# Altium integrated library WCAP-ATG8_rev15a.intlib: 195 symbols (part 1 of 2)
Pins are listed as number, name and electrical type; pins without a type are passive.

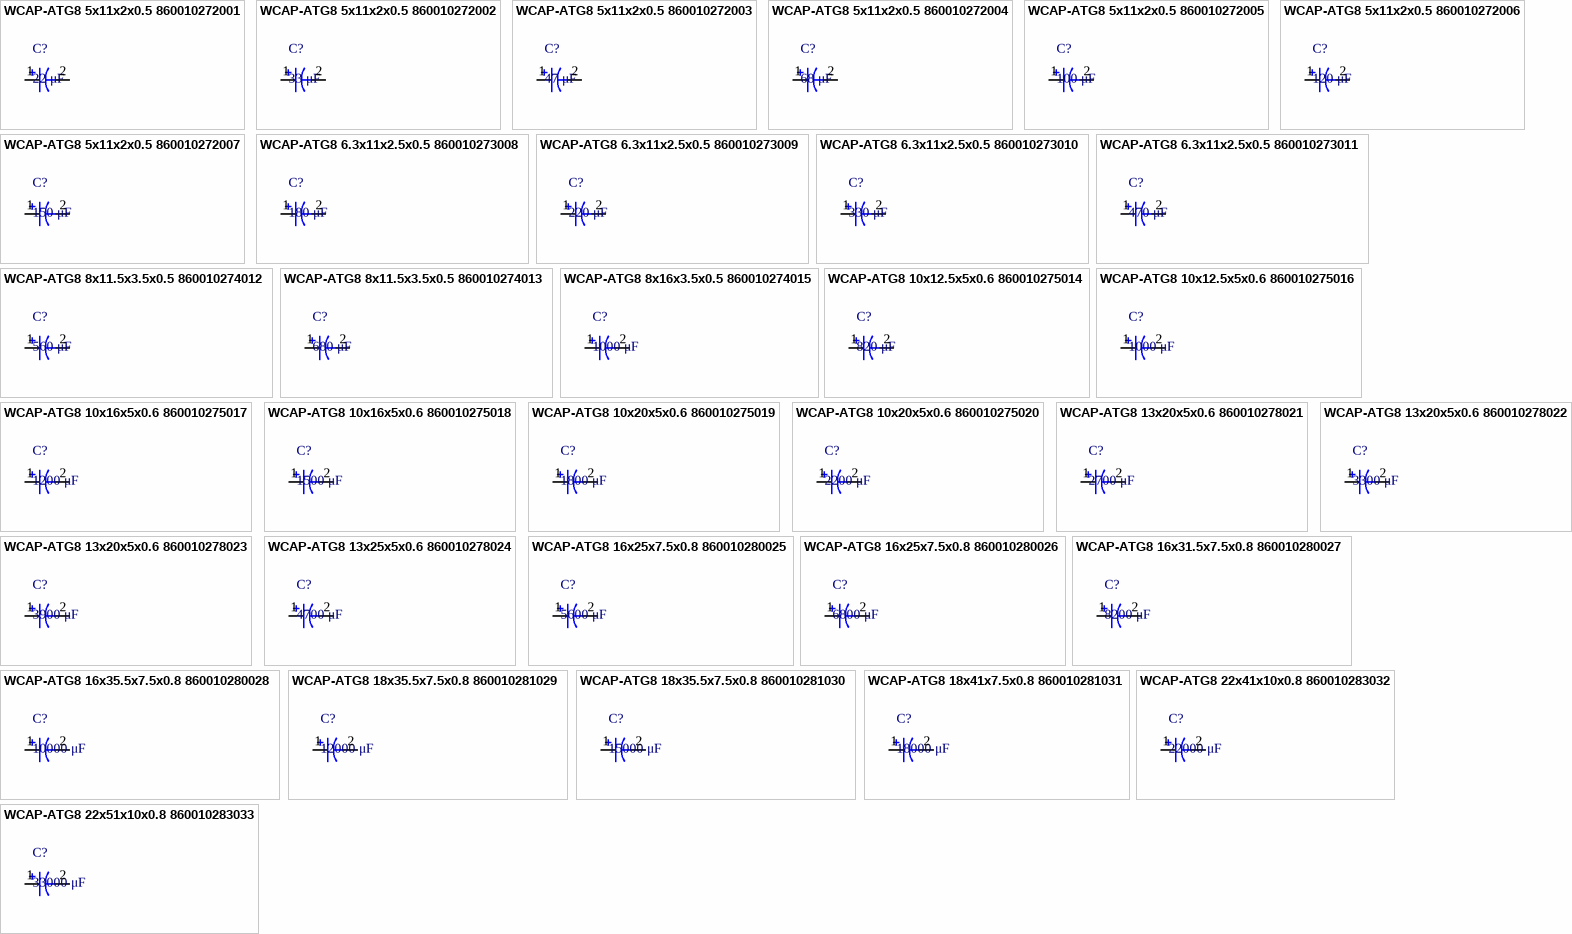
[diagram p0: symbols WCAP-ATG8 5x11x2x0.5 860010272001 to WCAP-ATG8 22x51x10x0.8 860010283033]

## WCAP-ATG8 5x11x2x0.5 860010272001
designator C?, comment 22 μF
WCAP-ATG8 Aluminum Electrolytic Capacitors , 22 μF; + / - 20%; 10 V , 5 x 11; Manufacturer: Wurth Elektronik; partNo: 860010272001; E-mail: libraries@we-online.com; Characteristics: Aluminum Electrolytic Capacitor; Recommended soldering: Wave; Operating temperature:–40 °C to +85 °C for UR < 400 V; 25 °C to +85 °C for UR ≥ 400 V; Wide capacitance value range; Load life: 2000 h @ +85 °C; ComponentLink1Description: Manufacturer; ComponentLink1URL: http://www.we-online.com; ComponentLink2Description: Datasheet; ComponentLink2URL: http://katalog.we-online.de/pbs/datasheet/860010272001.pdf; Created by: Karrer Zheng; Created Date: 6/8/2015; Capacitance: 22 μF; Application: Medium and high voltage type range from 160V-450V used as primary side input filter in power supply; Low voltage type used as energy storage or low frequency filtering in circuit, applied to general switching power supply, AC-DC converter, adapter, charger, TV, VCR, DC motor circuit filter, digital audio, digital cameras, digital video cameras, satellite receiver etc.
footprint WCAP-ATG8 5x11x2x0.5
pins: 1, 2

## WCAP-ATG8 5x11x2x0.5 860010272002
designator C?, comment 33 μF
WCAP-ATG8 Aluminum Electrolytic Capacitors , 33 μF; + / - 20%; 10 V , 5 x 11; Manufacturer: Wurth Elektronik; partNo: 860010272002; E-mail: libraries@we-online.com; Characteristics: Aluminum Electrolytic Capacitor; Recommended soldering: Wave; Operating temperature:–40 °C to +85 °C for UR < 400 V; 25 °C to +85 °C for UR ≥ 400 V; Wide capacitance value range; Load life: 2000 h @ +85 °C; ComponentLink1Description: Manufacturer; ComponentLink1URL: http://www.we-online.com; ComponentLink2Description: Datasheet; ComponentLink2URL: http://katalog.we-online.de/pbs/datasheet/860010272002.pdf; Created by: Karrer Zheng; Created Date: 6/8/2015; Capacitance: 33 μF; Application: Medium and high voltage type range from 160V-450V used as primary side input filter in power supply; Low voltage type used as energy storage or low frequency filtering in circuit, applied to general switching power supply, AC-DC converter, adapter, charger, TV, VCR, DC motor circuit filter, digital audio, digital cameras, digital video cameras, satellite receiver etc.
footprint WCAP-ATG8 5x11x2x0.5
pins: 1, 2

## WCAP-ATG8 5x11x2x0.5 860010272003
designator C?, comment 47 μF
WCAP-ATG8 Aluminum Electrolytic Capacitors , 47 μF; + / - 20%; 10 V , 5 x 11; Manufacturer: Wurth Elektronik; partNo: 860010272003; E-mail: libraries@we-online.com; Characteristics: Aluminum Electrolytic Capacitor; Recommended soldering: Wave; Operating temperature:–40 °C to +85 °C for UR < 400 V; 25 °C to +85 °C for UR ≥ 400 V; Wide capacitance value range; Load life: 2000 h @ +85 °C; ComponentLink1Description: Manufacturer; ComponentLink1URL: http://www.we-online.com; ComponentLink2Description: Datasheet; ComponentLink2URL: http://katalog.we-online.de/pbs/datasheet/860010272003.pdf; Created by: Karrer Zheng; Created Date: 6/8/2015; Capacitance: 47 μF; Application: Medium and high voltage type range from 160V-450V used as primary side input filter in power supply; Low voltage type used as energy storage or low frequency filtering in circuit, applied to general switching power supply, AC-DC converter, adapter, charger, TV, VCR, DC motor circuit filter, digital audio, digital cameras, digital video cameras, satellite receiver etc.
footprint WCAP-ATG8 5x11x2x0.5
pins: 1, 2

## WCAP-ATG8 5x11x2x0.5 860010272004
designator C?, comment 68 μF
WCAP-ATG8 Aluminum Electrolytic Capacitors , 68 μF; + / - 20%; 10 V , 5 x 11; Manufacturer: Wurth Elektronik; partNo: 860010272004; E-mail: libraries@we-online.com; Characteristics: Aluminum Electrolytic Capacitor; Recommended soldering: Wave; Operating temperature:–40 °C to +85 °C for UR < 400 V; 25 °C to +85 °C for UR ≥ 400 V; Wide capacitance value range; Load life: 2000 h @ +85 °C; ComponentLink1Description: Manufacturer; ComponentLink1URL: http://www.we-online.com; ComponentLink2Description: Datasheet; ComponentLink2URL: http://katalog.we-online.de/pbs/datasheet/860010272004.pdf; Created by: Karrer Zheng; Created Date: 6/8/2015; Capacitance: 68 μF; Application: Medium and high voltage type range from 160V-450V used as primary side input filter in power supply; Low voltage type used as energy storage or low frequency filtering in circuit, applied to general switching power supply, AC-DC converter, adapter, charger, TV, VCR, DC motor circuit filter, digital audio, digital cameras, digital video cameras, satellite receiver etc.
footprint WCAP-ATG8 5x11x2x0.5
pins: 1, 2

## WCAP-ATG8 5x11x2x0.5 860010272005
designator C?, comment 100 μF
WCAP-ATG8 Aluminum Electrolytic Capacitors , 100 μF; + / - 20%; 10 V , 5 x 11; Manufacturer: Wurth Elektronik; partNo: 860010272005; E-mail: libraries@we-online.com; Characteristics: Aluminum Electrolytic Capacitor; Recommended soldering: Wave; Operating temperature:–40 °C to +85 °C for UR < 400 V; 25 °C to +85 °C for UR ≥ 400 V; Wide capacitance value range; Load life: 2000 h @ +85 °C; ComponentLink1Description: Manufacturer; ComponentLink1URL: http://www.we-online.com; ComponentLink2Description: Datasheet; ComponentLink2URL: http://katalog.we-online.de/pbs/datasheet/860010272005.pdf; Created by: Karrer Zheng; Created Date: 6/8/2015; Capacitance: 100 μF; Application: Medium and high voltage type range from 160V-450V used as primary side input filter in power supply; Low voltage type used as energy storage or low frequency filtering in circuit, applied to general switching power supply, AC-DC converter, adapter, charger, TV, VCR, DC motor circuit filter, digital audio, digital cameras, digital video cameras, satellite receiver etc.
footprint WCAP-ATG8 5x11x2x0.5
pins: 1, 2

## WCAP-ATG8 5x11x2x0.5 860010272006
designator C?, comment 120 μF
WCAP-ATG8 Aluminum Electrolytic Capacitors , 120 μF; + / - 20%; 10 V , 5 x 11; Manufacturer: Wurth Elektronik; partNo: 860010272006; E-mail: libraries@we-online.com; Characteristics: Aluminum Electrolytic Capacitor; Recommended soldering: Wave; Operating temperature:–40 °C to +85 °C for UR < 400 V; 25 °C to +85 °C for UR ≥ 400 V; Wide capacitance value range; Load life: 2000 h @ +85 °C; ComponentLink1Description: Manufacturer; ComponentLink1URL: http://www.we-online.com; ComponentLink2Description: Datasheet; ComponentLink2URL: http://katalog.we-online.de/pbs/datasheet/860010272006.pdf; Created by: Karrer Zheng; Created Date: 6/8/2015; Capacitance: 120 μF; Application: Medium and high voltage type range from 160V-450V used as primary side input filter in power supply; Low voltage type used as energy storage or low frequency filtering in circuit, applied to general switching power supply, AC-DC converter, adapter, charger, TV, VCR, DC motor circuit filter, digital audio, digital cameras, digital video cameras, satellite receiver etc.
footprint WCAP-ATG8 5x11x2x0.5
pins: 1, 2

## WCAP-ATG8 5x11x2x0.5 860010272007
designator C?, comment 150 μF
WCAP-ATG8 Aluminum Electrolytic Capacitors , 150 μF; + / - 20%; 10 V , 5 x 11; Manufacturer: Wurth Elektronik; partNo: 860010272007; E-mail: libraries@we-online.com; Characteristics: Aluminum Electrolytic Capacitor; Recommended soldering: Wave; Operating temperature:–40 °C to +85 °C for UR < 400 V; 25 °C to +85 °C for UR ≥ 400 V; Wide capacitance value range; Load life: 2000 h @ +85 °C; ComponentLink1Description: Manufacturer; ComponentLink1URL: http://www.we-online.com; ComponentLink2Description: Datasheet; ComponentLink2URL: http://katalog.we-online.de/pbs/datasheet/860010272007.pdf; Created by: Karrer Zheng; Created Date: 6/8/2015; Capacitance: 150 μF; Application: Medium and high voltage type range from 160V-450V used as primary side input filter in power supply; Low voltage type used as energy storage or low frequency filtering in circuit, applied to general switching power supply, AC-DC converter, adapter, charger, TV, VCR, DC motor circuit filter, digital audio, digital cameras, digital video cameras, satellite receiver etc.
footprint WCAP-ATG8 5x11x2x0.5
pins: 1, 2

## WCAP-ATG8 6.3x11x2.5x0.5 860010273008
designator C?, comment 180 μF
WCAP-ATG8 Aluminum Electrolytic Capacitors , 180 μF; + / - 20%; 10 V , 6,3 x 11; Manufacturer: Wurth Elektronik; partNo: 860010273008; E-mail: libraries@we-online.com; Characteristics: Aluminum Electrolytic Capacitor; Recommended soldering: Wave; Operating temperature:–40 °C to +85 °C for UR < 400 V; 25 °C to +85 °C for UR ≥ 400 V; Wide capacitance value range; Load life: 2000 h @ +85 °C; ComponentLink1Description: Manufacturer; ComponentLink1URL: http://www.we-online.com; ComponentLink2Description: Datasheet; ComponentLink2URL: http://katalog.we-online.de/pbs/datasheet/860010273008.pdf; Created by: Karrer Zheng; Created Date: 6/8/2015; Capacitance: 180 μF; Application: Medium and high voltage type range from 160V-450V used as primary side input filter in power supply; Low voltage type used as energy storage or low frequency filtering in circuit, applied to general switching power supply, AC-DC converter, adapter, charger, TV, VCR, DC motor circuit filter, digital audio, digital cameras, digital video cameras, satellite receiver etc.
footprint WCAP-ATG8 6.3x11x2.5x0.5
pins: 1, 2

## WCAP-ATG8 6.3x11x2.5x0.5 860010273009
designator C?, comment 220 μF
WCAP-ATG8 Aluminum Electrolytic Capacitors , 220 μF; + / - 20%; 10 V , 6,3 x 11; Manufacturer: Wurth Elektronik; partNo: 860010273009; E-mail: libraries@we-online.com; Characteristics: Aluminum Electrolytic Capacitor; Recommended soldering: Wave; Operating temperature:–40 °C to +85 °C for UR < 400 V; 25 °C to +85 °C for UR ≥ 400 V; Wide capacitance value range; Load life: 2000 h @ +85 °C; ComponentLink1Description: Manufacturer; ComponentLink1URL: http://www.we-online.com; ComponentLink2Description: Datasheet; ComponentLink2URL: http://katalog.we-online.de/pbs/datasheet/860010273009.pdf; Created by: Karrer Zheng; Created Date: 6/8/2015; Capacitance: 220 μF; Application: Medium and high voltage type range from 160V-450V used as primary side input filter in power supply; Low voltage type used as energy storage or low frequency filtering in circuit, applied to general switching power supply, AC-DC converter, adapter, charger, TV, VCR, DC motor circuit filter, digital audio, digital cameras, digital video cameras, satellite receiver etc.
footprint WCAP-ATG8 6.3x11x2.5x0.5
pins: 1, 2

## WCAP-ATG8 6.3x11x2.5x0.5 860010273010
designator C?, comment 330 μF
WCAP-ATG8 Aluminum Electrolytic Capacitors , 330 μF; + / - 20%; 10 V , 6,3 x 11; Manufacturer: Wurth Elektronik; partNo: 860010273010; E-mail: libraries@we-online.com; Characteristics: Aluminum Electrolytic Capacitor; Recommended soldering: Wave; Operating temperature:–40 °C to +85 °C for UR < 400 V; 25 °C to +85 °C for UR ≥ 400 V; Wide capacitance value range; Load life: 2000 h @ +85 °C; ComponentLink1Description: Manufacturer; ComponentLink1URL: http://www.we-online.com; ComponentLink2Description: Datasheet; ComponentLink2URL: http://katalog.we-online.de/pbs/datasheet/860010273010.pdf; Created by: Karrer Zheng; Created Date: 6/8/2015; Capacitance: 330 μF; Application: Medium and high voltage type range from 160V-450V used as primary side input filter in power supply; Low voltage type used as energy storage or low frequency filtering in circuit, applied to general switching power supply, AC-DC converter, adapter, charger, TV, VCR, DC motor circuit filter, digital audio, digital cameras, digital video cameras, satellite receiver etc.
footprint WCAP-ATG8 6.3x11x2.5x0.5
pins: 1, 2

## WCAP-ATG8 6.3x11x2.5x0.5 860010273011
designator C?, comment 470 μF
WCAP-ATG8 Aluminum Electrolytic Capacitors , 470 μF; + / - 20%; 10 V , 6,3 x 11; Manufacturer: Wurth Elektronik; partNo: 860010273011; E-mail: libraries@we-online.com; Characteristics: Aluminum Electrolytic Capacitor; Recommended soldering: Wave; Operating temperature:–40 °C to +85 °C for UR < 400 V; 25 °C to +85 °C for UR ≥ 400 V; Wide capacitance value range; Load life: 2000 h @ +85 °C; ComponentLink1Description: Manufacturer; ComponentLink1URL: http://www.we-online.com; ComponentLink2Description: Datasheet; ComponentLink2URL: http://katalog.we-online.de/pbs/datasheet/860010273011.pdf; Created by: Karrer Zheng; Created Date: 6/8/2015; Capacitance: 470 μF; Application: Medium and high voltage type range from 160V-450V used as primary side input filter in power supply; Low voltage type used as energy storage or low frequency filtering in circuit, applied to general switching power supply, AC-DC converter, adapter, charger, TV, VCR, DC motor circuit filter, digital audio, digital cameras, digital video cameras, satellite receiver etc.
footprint WCAP-ATG8 6.3x11x2.5x0.5
pins: 1, 2

## WCAP-ATG8 8x11.5x3.5x0.5 860010274012
designator C?, comment 560 μF
WCAP-ATG8 Aluminum Electrolytic Capacitors , 560 μF; + / - 20%; 10 V , 8 x 11,5; Manufacturer: Wurth Elektronik; partNo: 860010274012; E-mail: libraries@we-online.com; Characteristics: Aluminum Electrolytic Capacitor; Recommended soldering: Wave; Operating temperature:–40 °C to +85 °C for UR < 400 V; 25 °C to +85 °C for UR ≥ 400 V; Wide capacitance value range; Load life: 2000 h @ +85 °C; ComponentLink1Description: Manufacturer; ComponentLink1URL: http://www.we-online.com; ComponentLink2Description: Datasheet; ComponentLink2URL: http://katalog.we-online.de/pbs/datasheet/860010274012.pdf; Created by: Karrer Zheng; Created Date: 6/8/2015; Capacitance: 560 μF; Application: Medium and high voltage type range from 160V-450V used as primary side input filter in power supply; Low voltage type used as energy storage or low frequency filtering in circuit, applied to general switching power supply, AC-DC converter, adapter, charger, TV, VCR, DC motor circuit filter, digital audio, digital cameras, digital video cameras, satellite receiver etc.
footprint WCAP-ATG8 8x11.5x3.5x0.5
pins: 1, 2

## WCAP-ATG8 8x11.5x3.5x0.5 860010274013
designator C?, comment 680 μF
WCAP-ATG8 Aluminum Electrolytic Capacitors , 680 μF; + / - 20%; 10 V , 8 x 11,5; Manufacturer: Wurth Elektronik; partNo: 860010274013; E-mail: libraries@we-online.com; Characteristics: Aluminum Electrolytic Capacitor; Recommended soldering: Wave; Operating temperature:–40 °C to +85 °C for UR < 400 V; 25 °C to +85 °C for UR ≥ 400 V; Wide capacitance value range; Load life: 2000 h @ +85 °C; ComponentLink1Description: Manufacturer; ComponentLink1URL: http://www.we-online.com; ComponentLink2Description: Datasheet; ComponentLink2URL: http://katalog.we-online.de/pbs/datasheet/860010274013.pdf; Created by: Karrer Zheng; Created Date: 6/8/2015; Capacitance: 680 μF; Application: Medium and high voltage type range from 160V-450V used as primary side input filter in power supply; Low voltage type used as energy storage or low frequency filtering in circuit, applied to general switching power supply, AC-DC converter, adapter, charger, TV, VCR, DC motor circuit filter, digital audio, digital cameras, digital video cameras, satellite receiver etc.
footprint WCAP-ATG8 8x11.5x3.5x0.5
pins: 1, 2

## WCAP-ATG8 8x16x3.5x0.5 860010274015
designator C?, comment 1000 μF
WCAP-ATG8 Aluminum Electrolytic Capacitors , 1000 μF; + / - 20%; 10 V , 8 x 16; Manufacturer: Wurth Elektronik; partNo: 860010274015; E-mail: libraries@we-online.com; Characteristics: Aluminum Electrolytic Capacitor; Recommended soldering: Wave; Operating temperature:–40 °C to +85 °C for UR < 400 V; 25 °C to +85 °C for UR ≥ 400 V; Wide capacitance value range; Load life: 2000 h @ +85 °C; ComponentLink1Description: Manufacturer; ComponentLink1URL: http://www.we-online.com; ComponentLink2Description: Datasheet; ComponentLink2URL: http://katalog.we-online.de/pbs/datasheet/860010274015.pdf; Created by: Karrer Zheng; Created Date: 6/8/2015; Capacitance: 1000 μF; Application: Medium and high voltage type range from 160V-450V used as primary side input filter in power supply; Low voltage type used as energy storage or low frequency filtering in circuit, applied to general switching power supply, AC-DC converter, adapter, charger, TV, VCR, DC motor circuit filter, digital audio, digital cameras, digital video cameras, satellite receiver etc.
footprint WCAP-ATG8 8x16x3.5x0.5
pins: 1, 2

## WCAP-ATG8 10x12.5x5x0.6 860010275014
designator C?, comment 820 μF
WCAP-ATG8 Aluminum Electrolytic Capacitors , 820 μF; + / - 20%; 10 V , 10 x 12,5; Manufacturer: Wurth Elektronik; partNo: 860010275014; E-mail: libraries@we-online.com; Characteristics: Aluminum Electrolytic Capacitor; Recommended soldering: Wave; Operating temperature:–40 °C to +85 °C for UR < 400 V; 25 °C to +85 °C for UR ≥ 400 V; Wide capacitance value range; Load life: 2000 h @ +85 °C; ComponentLink1Description: Manufacturer; ComponentLink1URL: http://www.we-online.com; ComponentLink2Description: Datasheet; ComponentLink2URL: http://katalog.we-online.de/pbs/datasheet/860010275014.pdf; Created by: Karrer Zheng; Created Date: 6/8/2015; Capacitance: 820 μF; Application: Medium and high voltage type range from 160V-450V used as primary side input filter in power supply; Low voltage type used as energy storage or low frequency filtering in circuit, applied to general switching power supply, AC-DC converter, adapter, charger, TV, VCR, DC motor circuit filter, digital audio, digital cameras, digital video cameras, satellite receiver etc.
footprint WCAP-ATG8 10x12.5x5x0.6
pins: 1, 2

## WCAP-ATG8 10x12.5x5x0.6 860010275016
designator C?, comment 1000 μF
WCAP-ATG8 Aluminum Electrolytic Capacitors , 1000 μF; + / - 20%; 10 V , 10 x 12,5; Manufacturer: Wurth Elektronik; partNo: 860010275016; E-mail: libraries@we-online.com; Characteristics: Aluminum Electrolytic Capacitor; Recommended soldering: Wave; Operating temperature:–40 °C to +85 °C for UR < 400 V; 25 °C to +85 °C for UR ≥ 400 V; Wide capacitance value range; Load life: 2000 h @ +85 °C; ComponentLink1Description: Manufacturer; ComponentLink1URL: http://www.we-online.com; ComponentLink2Description: Datasheet; ComponentLink2URL: http://katalog.we-online.de/pbs/datasheet/860010275016.pdf; Created by: Karrer Zheng; Created Date: 6/8/2015; Capacitance: 1000 μF; Application: Medium and high voltage type range from 160V-450V used as primary side input filter in power supply; Low voltage type used as energy storage or low frequency filtering in circuit, applied to general switching power supply, AC-DC converter, adapter, charger, TV, VCR, DC motor circuit filter, digital audio, digital cameras, digital video cameras, satellite receiver etc.
footprint WCAP-ATG8 10x12.5x5x0.6
pins: 1, 2

## WCAP-ATG8 10x16x5x0.6 860010275017
designator C?, comment 1200 μF
WCAP-ATG8 Aluminum Electrolytic Capacitors , 1200 μF; + / - 20%; 10 V , 10 x 16; Manufacturer: Wurth Elektronik; partNo: 860010275017; E-mail: libraries@we-online.com; Characteristics: Aluminum Electrolytic Capacitor; Recommended soldering: Wave; Operating temperature:–40 °C to +85 °C for UR < 400 V; 25 °C to +85 °C for UR ≥ 400 V; Wide capacitance value range; Load life: 2000 h @ +85 °C; ComponentLink1Description: Manufacturer; ComponentLink1URL: http://www.we-online.com; ComponentLink2Description: Datasheet; ComponentLink2URL: http://katalog.we-online.de/pbs/datasheet/860010275017.pdf; Created by: Karrer Zheng; Created Date: 6/8/2015; Capacitance: 1200 μF; Application: Medium and high voltage type range from 160V-450V used as primary side input filter in power supply; Low voltage type used as energy storage or low frequency filtering in circuit, applied to general switching power supply, AC-DC converter, adapter, charger, TV, VCR, DC motor circuit filter, digital audio, digital cameras, digital video cameras, satellite receiver etc.
footprint WCAP-ATG8 10x16x5x0.6
pins: 1, 2

## WCAP-ATG8 10x16x5x0.6 860010275018
designator C?, comment 1500 μF
WCAP-ATG8 Aluminum Electrolytic Capacitors , 1500 μF; + / - 20%; 10 V , 10 x 16; Manufacturer: Wurth Elektronik; partNo: 860010275018; E-mail: libraries@we-online.com; Characteristics: Aluminum Electrolytic Capacitor; Recommended soldering: Wave; Operating temperature:–40 °C to +85 °C for UR < 400 V; 25 °C to +85 °C for UR ≥ 400 V; Wide capacitance value range; Load life: 2000 h @ +85 °C; ComponentLink1Description: Manufacturer; ComponentLink1URL: http://www.we-online.com; ComponentLink2Description: Datasheet; ComponentLink2URL: http://katalog.we-online.de/pbs/datasheet/860010275018.pdf; Created by: Karrer Zheng; Created Date: 6/8/2015; Capacitance: 1500 μF; Application: Medium and high voltage type range from 160V-450V used as primary side input filter in power supply; Low voltage type used as energy storage or low frequency filtering in circuit, applied to general switching power supply, AC-DC converter, adapter, charger, TV, VCR, DC motor circuit filter, digital audio, digital cameras, digital video cameras, satellite receiver etc.
footprint WCAP-ATG8 10x16x5x0.6
pins: 1, 2

## WCAP-ATG8 10x20x5x0.6 860010275019
designator C?, comment 1800 μF
WCAP-ATG8 Aluminum Electrolytic Capacitors , 1800 μF; + / - 20%; 10 V , 10 x 20; Manufacturer: Wurth Elektronik; partNo: 860010275019; E-mail: libraries@we-online.com; Characteristics: Aluminum Electrolytic Capacitor; Recommended soldering: Wave; Operating temperature:–40 °C to +85 °C for UR < 400 V; 25 °C to +85 °C for UR ≥ 400 V; Wide capacitance value range; Load life: 2000 h @ +85 °C; ComponentLink1Description: Manufacturer; ComponentLink1URL: http://www.we-online.com; ComponentLink2Description: Datasheet; ComponentLink2URL: http://katalog.we-online.de/pbs/datasheet/860010275019.pdf; Created by: Karrer Zheng; Created Date: 6/8/2015; Capacitance: 1800 μF; Application: Medium and high voltage type range from 160V-450V used as primary side input filter in power supply; Low voltage type used as energy storage or low frequency filtering in circuit, applied to general switching power supply, AC-DC converter, adapter, charger, TV, VCR, DC motor circuit filter, digital audio, digital cameras, digital video cameras, satellite receiver etc.
footprint WCAP-ATG8 10x20x5x0.6
pins: 1, 2

## WCAP-ATG8 10x20x5x0.6 860010275020
designator C?, comment 2200 μF
WCAP-ATG8 Aluminum Electrolytic Capacitors , 2200 μF; + / - 20%; 10 V , 10 x 20; Manufacturer: Wurth Elektronik; partNo: 860010275020; E-mail: libraries@we-online.com; Characteristics: Aluminum Electrolytic Capacitor; Recommended soldering: Wave; Operating temperature:–40 °C to +85 °C for UR < 400 V; 25 °C to +85 °C for UR ≥ 400 V; Wide capacitance value range; Load life: 2000 h @ +85 °C; ComponentLink1Description: Manufacturer; ComponentLink1URL: http://www.we-online.com; ComponentLink2Description: Datasheet; ComponentLink2URL: http://katalog.we-online.de/pbs/datasheet/860010275020.pdf; Created by: Karrer Zheng; Created Date: 6/8/2015; Capacitance: 2200 μF; Application: Medium and high voltage type range from 160V-450V used as primary side input filter in power supply; Low voltage type used as energy storage or low frequency filtering in circuit, applied to general switching power supply, AC-DC converter, adapter, charger, TV, VCR, DC motor circuit filter, digital audio, digital cameras, digital video cameras, satellite receiver etc.
footprint WCAP-ATG8 10x20x5x0.6
pins: 1, 2

## WCAP-ATG8 13x20x5x0.6 860010278021
designator C?, comment 2700 μF
WCAP-ATG8 Aluminum Electrolytic Capacitors , 2700 μF; + / - 20%; 10 V , 13 x 20; Manufacturer: Wurth Elektronik; partNo: 860010278021; E-mail: libraries@we-online.com; Characteristics: Aluminum Electrolytic Capacitor; Recommended soldering: Wave; Operating temperature:–40 °C to +85 °C for UR < 400 V; 25 °C to +85 °C for UR ≥ 400 V; Wide capacitance value range; Load life: 2000 h @ +85 °C; ComponentLink1Description: Manufacturer; ComponentLink1URL: http://www.we-online.com; ComponentLink2Description: Datasheet; ComponentLink2URL: http://katalog.we-online.de/pbs/datasheet/860010278021.pdf; Created by: Karrer Zheng; Created Date: 6/8/2015; Capacitance: 2700 μF; Application: Medium and high voltage type range from 160V-450V used as primary side input filter in power supply; Low voltage type used as energy storage or low frequency filtering in circuit, applied to general switching power supply, AC-DC converter, adapter, charger, TV, VCR, DC motor circuit filter, digital audio, digital cameras, digital video cameras, satellite receiver etc.
footprint WCAP-ATG8 13x20x5x0.6
pins: 1, 2

## WCAP-ATG8 13x20x5x0.6 860010278022
designator C?, comment 3300 μF
WCAP-ATG8 Aluminum Electrolytic Capacitors , 3300 μF; + / - 20%; 10 V , 13 x 20; Manufacturer: Wurth Elektronik; partNo: 860010278022; E-mail: libraries@we-online.com; Characteristics: Aluminum Electrolytic Capacitor; Recommended soldering: Wave; Operating temperature:–40 °C to +85 °C for UR < 400 V; 25 °C to +85 °C for UR ≥ 400 V; Wide capacitance value range; Load life: 2000 h @ +85 °C; ComponentLink1Description: Manufacturer; ComponentLink1URL: http://www.we-online.com; ComponentLink2Description: Datasheet; ComponentLink2URL: http://katalog.we-online.de/pbs/datasheet/860010278022.pdf; Created by: Karrer Zheng; Created Date: 6/8/2015; Capacitance: 3300 μF; Application: Medium and high voltage type range from 160V-450V used as primary side input filter in power supply; Low voltage type used as energy storage or low frequency filtering in circuit, applied to general switching power supply, AC-DC converter, adapter, charger, TV, VCR, DC motor circuit filter, digital audio, digital cameras, digital video cameras, satellite receiver etc.
footprint WCAP-ATG8 13x20x5x0.6
pins: 1, 2

## WCAP-ATG8 13x20x5x0.6 860010278023
designator C?, comment 3900 μF
WCAP-ATG8 Aluminum Electrolytic Capacitors , 3900 μF; + / - 20%; 10 V , 13 x 20; Manufacturer: Wurth Elektronik; partNo: 860010278023; E-mail: libraries@we-online.com; Characteristics: Aluminum Electrolytic Capacitor; Recommended soldering: Wave; Operating temperature:–40 °C to +85 °C for UR < 400 V; 25 °C to +85 °C for UR ≥ 400 V; Wide capacitance value range; Load life: 2000 h @ +85 °C; ComponentLink1Description: Manufacturer; ComponentLink1URL: http://www.we-online.com; ComponentLink2Description: Datasheet; ComponentLink2URL: http://katalog.we-online.de/pbs/datasheet/860010278023.pdf; Created by: Karrer Zheng; Created Date: 6/8/2015; Capacitance: 3900 μF; Application: Medium and high voltage type range from 160V-450V used as primary side input filter in power supply; Low voltage type used as energy storage or low frequency filtering in circuit, applied to general switching power supply, AC-DC converter, adapter, charger, TV, VCR, DC motor circuit filter, digital audio, digital cameras, digital video cameras, satellite receiver etc.
footprint WCAP-ATG8 13x20x5x0.6
pins: 1, 2

## WCAP-ATG8 13x25x5x0.6 860010278024
designator C?, comment 4700 μF
WCAP-ATG8 Aluminum Electrolytic Capacitors , 4700 μF; + / - 20%; 10 V , 13 x 25; Manufacturer: Wurth Elektronik; partNo: 860010278024; E-mail: libraries@we-online.com; Characteristics: Aluminum Electrolytic Capacitor; Recommended soldering: Wave; Operating temperature:–40 °C to +85 °C for UR < 400 V; 25 °C to +85 °C for UR ≥ 400 V; Wide capacitance value range; Load life: 2000 h @ +85 °C; ComponentLink1Description: Manufacturer; ComponentLink1URL: http://www.we-online.com; ComponentLink2Description: Datasheet; ComponentLink2URL: http://katalog.we-online.de/pbs/datasheet/860010278024.pdf; Created by: Karrer Zheng; Created Date: 6/8/2015; Capacitance: 4700 μF; Application: Medium and high voltage type range from 160V-450V used as primary side input filter in power supply; Low voltage type used as energy storage or low frequency filtering in circuit, applied to general switching power supply, AC-DC converter, adapter, charger, TV, VCR, DC motor circuit filter, digital audio, digital cameras, digital video cameras, satellite receiver etc.
footprint WCAP-ATG8 13x25x5x0.6
pins: 1, 2

## WCAP-ATG8 16x25x7.5x0.8 860010280025
designator C?, comment 5600 μF
WCAP-ATG8 Aluminum Electrolytic Capacitors , 5600 μF; + / - 20%; 10 V , 16 x 25; Manufacturer: Wurth Elektronik; partNo: 860010280025; E-mail: libraries@we-online.com; Characteristics: Aluminum Electrolytic Capacitor; Recommended soldering: Wave; Operating temperature:–40 °C to +85 °C for UR < 400 V; 25 °C to +85 °C for UR ≥ 400 V; Wide capacitance value range; Load life: 2000 h @ +85 °C; ComponentLink1Description: Manufacturer; ComponentLink1URL: http://www.we-online.com; ComponentLink2Description: Datasheet; ComponentLink2URL: http://katalog.we-online.de/pbs/datasheet/860010280025.pdf; Created by: Karrer Zheng; Created Date: 6/8/2015; Capacitance: 5600 μF; Application: Medium and high voltage type range from 160V-450V used as primary side input filter in power supply; Low voltage type used as energy storage or low frequency filtering in circuit, applied to general switching power supply, AC-DC converter, adapter, charger, TV, VCR, DC motor circuit filter, digital audio, digital cameras, digital video cameras, satellite receiver etc.
footprint WCAP-ATG8 16x25x7.5x0.8
pins: 1, 2

## WCAP-ATG8 16x25x7.5x0.8 860010280026
designator C?, comment 6800 μF
WCAP-ATG8 Aluminum Electrolytic Capacitors , 6800 μF; + / - 20%; 10 V , 16 x 25; Manufacturer: Wurth Elektronik; partNo: 860010280026; E-mail: libraries@we-online.com; Characteristics: Aluminum Electrolytic Capacitor; Recommended soldering: Wave; Operating temperature:–40 °C to +85 °C for UR < 400 V; 25 °C to +85 °C for UR ≥ 400 V; Wide capacitance value range; Load life: 2000 h @ +85 °C; ComponentLink1Description: Manufacturer; ComponentLink1URL: http://www.we-online.com; ComponentLink2Description: Datasheet; ComponentLink2URL: http://katalog.we-online.de/pbs/datasheet/860010280026.pdf; Created by: Karrer Zheng; Created Date: 6/8/2015; Capacitance: 6800 μF; Application: Medium and high voltage type range from 160V-450V used as primary side input filter in power supply; Low voltage type used as energy storage or low frequency filtering in circuit, applied to general switching power supply, AC-DC converter, adapter, charger, TV, VCR, DC motor circuit filter, digital audio, digital cameras, digital video cameras, satellite receiver etc.
footprint WCAP-ATG8 16x25x7.5x0.8
pins: 1, 2

## WCAP-ATG8 16x31.5x7.5x0.8 860010280027
designator C?, comment 8200 μF
WCAP-ATG8 Aluminum Electrolytic Capacitors , 8200 μF; + / - 20%; 10 V , 16 x 31,5; Manufacturer: Wurth Elektronik; partNo: 860010280027; E-mail: libraries@we-online.com; Characteristics: Aluminum Electrolytic Capacitor; Recommended soldering: Wave; Operating temperature:–40 °C to +85 °C for UR < 400 V; 25 °C to +85 °C for UR ≥ 400 V; Wide capacitance value range; Load life: 2000 h @ +85 °C; ComponentLink1Description: Manufacturer; ComponentLink1URL: http://www.we-online.com; ComponentLink2Description: Datasheet; ComponentLink2URL: http://katalog.we-online.de/pbs/datasheet/860010280027.pdf; Created by: Karrer Zheng; Created Date: 6/8/2015; Capacitance: 8200 μF; Application: Medium and high voltage type range from 160V-450V used as primary side input filter in power supply; Low voltage type used as energy storage or low frequency filtering in circuit, applied to general switching power supply, AC-DC converter, adapter, charger, TV, VCR, DC motor circuit filter, digital audio, digital cameras, digital video cameras, satellite receiver etc.
footprint WCAP-ATG8 16x31.5x7.5x0.8
pins: 1, 2

## WCAP-ATG8 16x35.5x7.5x0.8 860010280028
designator C?, comment 10000 μF
WCAP-ATG8 Aluminum Electrolytic Capacitors , 10000 μF; + / - 20%; 10 V , 16 x 35,5; Manufacturer: Wurth Elektronik; partNo: 860010280028; E-mail: libraries@we-online.com; Characteristics: Aluminum Electrolytic Capacitor; Recommended soldering: Wave; Operating temperature:–40 °C to +85 °C for UR < 400 V; 25 °C to +85 °C for UR ≥ 400 V; Wide capacitance value range; Load life: 2000 h @ +85 °C; ComponentLink1Description: Manufacturer; ComponentLink1URL: http://www.we-online.com; ComponentLink2Description: Datasheet; ComponentLink2URL: http://katalog.we-online.de/pbs/datasheet/860010280028.pdf; Created by: Karrer Zheng; Created Date: 6/8/2015; Capacitance: 10000 μF; Application: Medium and high voltage type range from 160V-450V used as primary side input filter in power supply; Low voltage type used as energy storage or low frequency filtering in circuit, applied to general switching power supply, AC-DC converter, adapter, charger, TV, VCR, DC motor circuit filter, digital audio, digital cameras, digital video cameras, satellite receiver etc.
footprint WCAP-ATG8 16x35.5x7.5x0.8
pins: 1, 2

## WCAP-ATG8 18x35.5x7.5x0.8 860010281029
designator C?, comment 12000 μF
WCAP-ATG8 Aluminum Electrolytic Capacitors , 12000 μF; + / - 20%; 10 V , 18 x 35,5; Manufacturer: Wurth Elektronik; partNo: 860010281029; E-mail: libraries@we-online.com; Characteristics: Aluminum Electrolytic Capacitor; Recommended soldering: Wave; Operating temperature:–40 °C to +85 °C for UR < 400 V; 25 °C to +85 °C for UR ≥ 400 V; Wide capacitance value range; Load life: 2000 h @ +85 °C; ComponentLink1Description: Manufacturer; ComponentLink1URL: http://www.we-online.com; ComponentLink2Description: Datasheet; ComponentLink2URL: http://katalog.we-online.de/pbs/datasheet/860010281029.pdf; Created by: Karrer Zheng; Created Date: 6/8/2015; Capacitance: 12000 μF; Application: Medium and high voltage type range from 160V-450V used as primary side input filter in power supply; Low voltage type used as energy storage or low frequency filtering in circuit, applied to general switching power supply, AC-DC converter, adapter, charger, TV, VCR, DC motor circuit filter, digital audio, digital cameras, digital video cameras, satellite receiver etc.
footprint WCAP-ATG8 18x35.5x7.5x0.8
pins: 1, 2

## WCAP-ATG8 18x35.5x7.5x0.8 860010281030
designator C?, comment 15000 μF
WCAP-ATG8 Aluminum Electrolytic Capacitors , 15000 μF; + / - 20%; 10 V , 18 x 35,5; Manufacturer: Wurth Elektronik; partNo: 860010281030; E-mail: libraries@we-online.com; Characteristics: Aluminum Electrolytic Capacitor; Recommended soldering: Wave; Operating temperature:–40 °C to +85 °C for UR < 400 V; 25 °C to +85 °C for UR ≥ 400 V; Wide capacitance value range; Load life: 2000 h @ +85 °C; ComponentLink1Description: Manufacturer; ComponentLink1URL: http://www.we-online.com; ComponentLink2Description: Datasheet; ComponentLink2URL: http://katalog.we-online.de/pbs/datasheet/860010281030.pdf; Created by: Karrer Zheng; Created Date: 6/8/2015; Capacitance: 15000 μF; Application: Medium and high voltage type range from 160V-450V used as primary side input filter in power supply; Low voltage type used as energy storage or low frequency filtering in circuit, applied to general switching power supply, AC-DC converter, adapter, charger, TV, VCR, DC motor circuit filter, digital audio, digital cameras, digital video cameras, satellite receiver etc.
footprint WCAP-ATG8 18x35.5x7.5x0.8
pins: 1, 2

## WCAP-ATG8 18x41x7.5x0.8 860010281031
designator C?, comment 18000 μF
WCAP-ATG8 Aluminum Electrolytic Capacitors , 18000 μF; + / - 20%; 10 V , 18 x 41; Manufacturer: Wurth Elektronik; partNo: 860010281031; E-mail: libraries@we-online.com; Characteristics: Aluminum Electrolytic Capacitor; Recommended soldering: Wave; Operating temperature:–40 °C to +85 °C for UR < 400 V; 25 °C to +85 °C for UR ≥ 400 V; Wide capacitance value range; Load life: 2000 h @ +85 °C; ComponentLink1Description: Manufacturer; ComponentLink1URL: http://www.we-online.com; ComponentLink2Description: Datasheet; ComponentLink2URL: http://katalog.we-online.de/pbs/datasheet/860010281031.pdf; Created by: Karrer Zheng; Created Date: 6/8/2015; Capacitance: 18000 μF; Application: Medium and high voltage type range from 160V-450V used as primary side input filter in power supply; Low voltage type used as energy storage or low frequency filtering in circuit, applied to general switching power supply, AC-DC converter, adapter, charger, TV, VCR, DC motor circuit filter, digital audio, digital cameras, digital video cameras, satellite receiver etc.
footprint WCAP-ATG8 18x41x7.5x0.8
pins: 1, 2

## WCAP-ATG8 22x41x10x0.8 860010283032
designator C?, comment 22000 μF
WCAP-ATG8 Aluminum Electrolytic Capacitors , 22000 μF; + / - 20%; 10 V , 22 x 41; Manufacturer: Wurth Elektronik; partNo: 860010283032; E-mail: libraries@we-online.com; Characteristics: Aluminum Electrolytic Capacitor; Recommended soldering: Wave; Operating temperature:–40 °C to +85 °C for UR < 400 V; 25 °C to +85 °C for UR ≥ 400 V; Wide capacitance value range; Load life: 2000 h @ +85 °C; ComponentLink1Description: Manufacturer; ComponentLink1URL: http://www.we-online.com; ComponentLink2Description: Datasheet; ComponentLink2URL: http://katalog.we-online.de/pbs/datasheet/860010283032.pdf; Created by: Karrer Zheng; Created Date: 6/8/2015; Capacitance: 22000 μF; Application: Medium and high voltage type range from 160V-450V used as primary side input filter in power supply; Low voltage type used as energy storage or low frequency filtering in circuit, applied to general switching power supply, AC-DC converter, adapter, charger, TV, VCR, DC motor circuit filter, digital audio, digital cameras, digital video cameras, satellite receiver etc.
footprint WCAP-ATG8 22x41x10x0.8
pins: 1, 2

## WCAP-ATG8 22x51x10x0.8 860010283033
designator C?, comment 33000 μF
WCAP-ATG8 Aluminum Electrolytic Capacitors , 33000 μF; + / - 20%; 10 V , 22 x 51; Manufacturer: Wurth Elektronik; partNo: 860010283033; E-mail: libraries@we-online.com; Characteristics: Aluminum Electrolytic Capacitor; Recommended soldering: Wave; Operating temperature:–40 °C to +85 °C for UR < 400 V; 25 °C to +85 °C for UR ≥ 400 V; Wide capacitance value range; Load life: 2000 h @ +85 °C; ComponentLink1Description: Manufacturer; ComponentLink1URL: http://www.we-online.com; ComponentLink2Description: Datasheet; ComponentLink2URL: http://katalog.we-online.de/pbs/datasheet/860010283033.pdf; Created by: Karrer Zheng; Created Date: 6/8/2015; Capacitance: 33000 μF; Application: Medium and high voltage type range from 160V-450V used as primary side input filter in power supply; Low voltage type used as energy storage or low frequency filtering in circuit, applied to general switching power supply, AC-DC converter, adapter, charger, TV, VCR, DC motor circuit filter, digital audio, digital cameras, digital video cameras, satellite receiver etc.
footprint WCAP-ATG8 22x51x10x0.8
pins: 1, 2


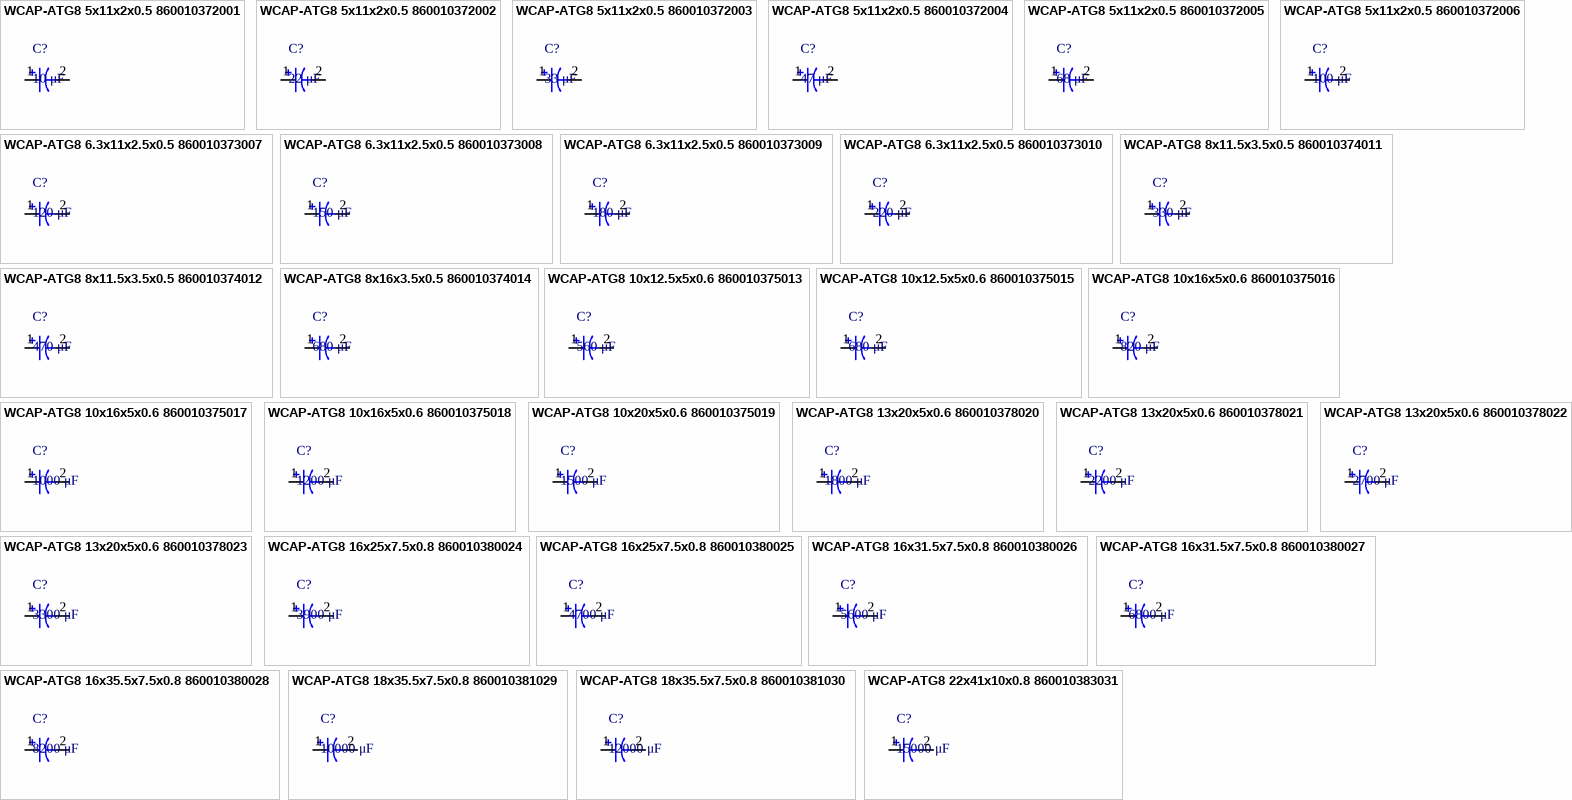
[diagram p1: symbols WCAP-ATG8 5x11x2x0.5 860010372001 to WCAP-ATG8 22x41x10x0.8 860010383031]

## WCAP-ATG8 5x11x2x0.5 860010372001
designator C?, comment 10 μF
WCAP-ATG8 Aluminum Electrolytic Capacitors , 10 μF; + / - 20%; 16 V , 5 x 11; Manufacturer: Wurth Elektronik; partNo: 860010372001; E-mail: libraries@we-online.com; Characteristics: Aluminum Electrolytic Capacitor; Recommended soldering: Wave; Operating temperature:–40 °C to +85 °C for UR < 400 V; 25 °C to +85 °C for UR ≥ 400 V; Wide capacitance value range; Load life: 2000 h @ +85 °C; ComponentLink1Description: Manufacturer; ComponentLink1URL: http://www.we-online.com; ComponentLink2Description: Datasheet; ComponentLink2URL: http://katalog.we-online.de/pbs/datasheet/860010372001.pdf; Created by: Karrer Zheng; Created Date: 6/8/2015; Capacitance: 10 μF; Application: Medium and high voltage type range from 160V-450V used as primary side input filter in power supply; Low voltage type used as energy storage or low frequency filtering in circuit, applied to general switching power supply, AC-DC converter, adapter, charger, TV, VCR, DC motor circuit filter, digital audio, digital cameras, digital video cameras, satellite receiver etc.
footprint WCAP-ATG8 5x11x2x0.5
pins: 1, 2

## WCAP-ATG8 5x11x2x0.5 860010372002
designator C?, comment 22 μF
WCAP-ATG8 Aluminum Electrolytic Capacitors , 22 μF; + / - 20%; 16 V , 5 x 11; Manufacturer: Wurth Elektronik; partNo: 860010372002; E-mail: libraries@we-online.com; Characteristics: Aluminum Electrolytic Capacitor; Recommended soldering: Wave; Operating temperature:–40 °C to +85 °C for UR < 400 V; 25 °C to +85 °C for UR ≥ 400 V; Wide capacitance value range; Load life: 2000 h @ +85 °C; ComponentLink1Description: Manufacturer; ComponentLink1URL: http://www.we-online.com; ComponentLink2Description: Datasheet; ComponentLink2URL: http://katalog.we-online.de/pbs/datasheet/860010372002.pdf; Created by: Karrer Zheng; Created Date: 6/8/2015; Capacitance: 22 μF; Application: Medium and high voltage type range from 160V-450V used as primary side input filter in power supply; Low voltage type used as energy storage or low frequency filtering in circuit, applied to general switching power supply, AC-DC converter, adapter, charger, TV, VCR, DC motor circuit filter, digital audio, digital cameras, digital video cameras, satellite receiver etc.
footprint WCAP-ATG8 5x11x2x0.5
pins: 1, 2

## WCAP-ATG8 5x11x2x0.5 860010372003
designator C?, comment 33 μF
WCAP-ATG8 Aluminum Electrolytic Capacitors , 33 μF; + / - 20%; 16 V , 5 x 11; Manufacturer: Wurth Elektronik; partNo: 860010372003; E-mail: libraries@we-online.com; Characteristics: Aluminum Electrolytic Capacitor; Recommended soldering: Wave; Operating temperature:–40 °C to +85 °C for UR < 400 V; 25 °C to +85 °C for UR ≥ 400 V; Wide capacitance value range; Load life: 2000 h @ +85 °C; ComponentLink1Description: Manufacturer; ComponentLink1URL: http://www.we-online.com; ComponentLink2Description: Datasheet; ComponentLink2URL: http://katalog.we-online.de/pbs/datasheet/860010372003.pdf; Created by: Karrer Zheng; Created Date: 6/8/2015; Capacitance: 33 μF; Application: Medium and high voltage type range from 160V-450V used as primary side input filter in power supply; Low voltage type used as energy storage or low frequency filtering in circuit, applied to general switching power supply, AC-DC converter, adapter, charger, TV, VCR, DC motor circuit filter, digital audio, digital cameras, digital video cameras, satellite receiver etc.
footprint WCAP-ATG8 5x11x2x0.5
pins: 1, 2

## WCAP-ATG8 5x11x2x0.5 860010372004
designator C?, comment 47 μF
WCAP-ATG8 Aluminum Electrolytic Capacitors , 47 μF; + / - 20%; 16 V , 5 x 11; Manufacturer: Wurth Elektronik; partNo: 860010372004; E-mail: libraries@we-online.com; Characteristics: Aluminum Electrolytic Capacitor; Recommended soldering: Wave; Operating temperature:–40 °C to +85 °C for UR < 400 V; 25 °C to +85 °C for UR ≥ 400 V; Wide capacitance value range; Load life: 2000 h @ +85 °C; ComponentLink1Description: Manufacturer; ComponentLink1URL: http://www.we-online.com; ComponentLink2Description: Datasheet; ComponentLink2URL: http://katalog.we-online.de/pbs/datasheet/860010372004.pdf; Created by: Karrer Zheng; Created Date: 6/8/2015; Capacitance: 47 μF; Application: Medium and high voltage type range from 160V-450V used as primary side input filter in power supply; Low voltage type used as energy storage or low frequency filtering in circuit, applied to general switching power supply, AC-DC converter, adapter, charger, TV, VCR, DC motor circuit filter, digital audio, digital cameras, digital video cameras, satellite receiver etc.
footprint WCAP-ATG8 5x11x2x0.5
pins: 1, 2

## WCAP-ATG8 5x11x2x0.5 860010372005
designator C?, comment 68 μF
WCAP-ATG8 Aluminum Electrolytic Capacitors , 68 μF; + / - 20%; 16 V , 5 x 11; Manufacturer: Wurth Elektronik; partNo: 860010372005; E-mail: libraries@we-online.com; Characteristics: Aluminum Electrolytic Capacitor; Recommended soldering: Wave; Operating temperature:–40 °C to +85 °C for UR < 400 V; 25 °C to +85 °C for UR ≥ 400 V; Wide capacitance value range; Load life: 2000 h @ +85 °C; ComponentLink1Description: Manufacturer; ComponentLink1URL: http://www.we-online.com; ComponentLink2Description: Datasheet; ComponentLink2URL: http://katalog.we-online.de/pbs/datasheet/860010372005.pdf; Created by: Karrer Zheng; Created Date: 6/8/2015; Capacitance: 68 μF; Application: Medium and high voltage type range from 160V-450V used as primary side input filter in power supply; Low voltage type used as energy storage or low frequency filtering in circuit, applied to general switching power supply, AC-DC converter, adapter, charger, TV, VCR, DC motor circuit filter, digital audio, digital cameras, digital video cameras, satellite receiver etc.
footprint WCAP-ATG8 5x11x2x0.5
pins: 1, 2

## WCAP-ATG8 5x11x2x0.5 860010372006
designator C?, comment 100 μF
WCAP-ATG8 Aluminum Electrolytic Capacitors , 100 μF; + / - 20%; 16 V , 5 x 11; Manufacturer: Wurth Elektronik; partNo: 860010372006; E-mail: libraries@we-online.com; Characteristics: Aluminum Electrolytic Capacitor; Recommended soldering: Wave; Operating temperature:–40 °C to +85 °C for UR < 400 V; 25 °C to +85 °C for UR ≥ 400 V; Wide capacitance value range; Load life: 2000 h @ +85 °C; ComponentLink1Description: Manufacturer; ComponentLink1URL: http://www.we-online.com; ComponentLink2Description: Datasheet; ComponentLink2URL: http://katalog.we-online.de/pbs/datasheet/860010372006.pdf; Created by: Karrer Zheng; Created Date: 6/8/2015; Capacitance: 100 μF; Application: Medium and high voltage type range from 160V-450V used as primary side input filter in power supply; Low voltage type used as energy storage or low frequency filtering in circuit, applied to general switching power supply, AC-DC converter, adapter, charger, TV, VCR, DC motor circuit filter, digital audio, digital cameras, digital video cameras, satellite receiver etc.
footprint WCAP-ATG8 5x11x2x0.5
pins: 1, 2

## WCAP-ATG8 6.3x11x2.5x0.5 860010373007
designator C?, comment 120 μF
WCAP-ATG8 Aluminum Electrolytic Capacitors , 120 μF; + / - 20%; 16 V , 6,3 x 11; Manufacturer: Wurth Elektronik; partNo: 860010373007; E-mail: libraries@we-online.com; Characteristics: Aluminum Electrolytic Capacitor; Recommended soldering: Wave; Operating temperature:–40 °C to +85 °C for UR < 400 V; 25 °C to +85 °C for UR ≥ 400 V; Wide capacitance value range; Load life: 2000 h @ +85 °C; ComponentLink1Description: Manufacturer; ComponentLink1URL: http://www.we-online.com; ComponentLink2Description: Datasheet; ComponentLink2URL: http://katalog.we-online.de/pbs/datasheet/860010373007.pdf; Created by: Karrer Zheng; Created Date: 6/8/2015; Capacitance: 120 μF; Application: Medium and high voltage type range from 160V-450V used as primary side input filter in power supply; Low voltage type used as energy storage or low frequency filtering in circuit, applied to general switching power supply, AC-DC converter, adapter, charger, TV, VCR, DC motor circuit filter, digital audio, digital cameras, digital video cameras, satellite receiver etc.
footprint WCAP-ATG8 6.3x11x2.5x0.5
pins: 1, 2

## WCAP-ATG8 6.3x11x2.5x0.5 860010373008
designator C?, comment 150 μF
WCAP-ATG8 Aluminum Electrolytic Capacitors , 150 μF; + / - 20%; 16 V , 6,3 x 11; Manufacturer: Wurth Elektronik; partNo: 860010373008; E-mail: libraries@we-online.com; Characteristics: Aluminum Electrolytic Capacitor; Recommended soldering: Wave; Operating temperature:–40 °C to +85 °C for UR < 400 V; 25 °C to +85 °C for UR ≥ 400 V; Wide capacitance value range; Load life: 2000 h @ +85 °C; ComponentLink1Description: Manufacturer; ComponentLink1URL: http://www.we-online.com; ComponentLink2Description: Datasheet; ComponentLink2URL: http://katalog.we-online.de/pbs/datasheet/860010373008.pdf; Created by: Karrer Zheng; Created Date: 6/8/2015; Capacitance: 150 μF; Application: Medium and high voltage type range from 160V-450V used as primary side input filter in power supply; Low voltage type used as energy storage or low frequency filtering in circuit, applied to general switching power supply, AC-DC converter, adapter, charger, TV, VCR, DC motor circuit filter, digital audio, digital cameras, digital video cameras, satellite receiver etc.
footprint WCAP-ATG8 6.3x11x2.5x0.5
pins: 1, 2

## WCAP-ATG8 6.3x11x2.5x0.5 860010373009
designator C?, comment 180 μF
WCAP-ATG8 Aluminum Electrolytic Capacitors , 180 μF; + / - 20%; 16 V , 6,3 x 11; Manufacturer: Wurth Elektronik; partNo: 860010373009; E-mail: libraries@we-online.com; Characteristics: Aluminum Electrolytic Capacitor; Recommended soldering: Wave; Operating temperature:–40 °C to +85 °C for UR < 400 V; 25 °C to +85 °C for UR ≥ 400 V; Wide capacitance value range; Load life: 2000 h @ +85 °C; ComponentLink1Description: Manufacturer; ComponentLink1URL: http://www.we-online.com; ComponentLink2Description: Datasheet; ComponentLink2URL: http://katalog.we-online.de/pbs/datasheet/860010373009.pdf; Created by: Karrer Zheng; Created Date: 6/8/2015; Capacitance: 180 μF; Application: Medium and high voltage type range from 160V-450V used as primary side input filter in power supply; Low voltage type used as energy storage or low frequency filtering in circuit, applied to general switching power supply, AC-DC converter, adapter, charger, TV, VCR, DC motor circuit filter, digital audio, digital cameras, digital video cameras, satellite receiver etc.
footprint WCAP-ATG8 6.3x11x2.5x0.5
pins: 1, 2

## WCAP-ATG8 6.3x11x2.5x0.5 860010373010
designator C?, comment 220 μF
WCAP-ATG8 Aluminum Electrolytic Capacitors , 220 μF; + / - 20%; 16 V , 6,3 x 11; Manufacturer: Wurth Elektronik; partNo: 860010373010; E-mail: libraries@we-online.com; Characteristics: Aluminum Electrolytic Capacitor; Recommended soldering: Wave; Operating temperature:–40 °C to +85 °C for UR < 400 V; 25 °C to +85 °C for UR ≥ 400 V; Wide capacitance value range; Load life: 2000 h @ +85 °C; ComponentLink1Description: Manufacturer; ComponentLink1URL: http://www.we-online.com; ComponentLink2Description: Datasheet; ComponentLink2URL: http://katalog.we-online.de/pbs/datasheet/860010373010.pdf; Created by: Karrer Zheng; Created Date: 6/8/2015; Capacitance: 220 μF; Application: Medium and high voltage type range from 160V-450V used as primary side input filter in power supply; Low voltage type used as energy storage or low frequency filtering in circuit, applied to general switching power supply, AC-DC converter, adapter, charger, TV, VCR, DC motor circuit filter, digital audio, digital cameras, digital video cameras, satellite receiver etc.
footprint WCAP-ATG8 6.3x11x2.5x0.5
pins: 1, 2

## WCAP-ATG8 8x11.5x3.5x0.5 860010374011
designator C?, comment 330 μF
WCAP-ATG8 Aluminum Electrolytic Capacitors , 330 μF; + / - 20%; 16 V , 8 x 11,5; Manufacturer: Wurth Elektronik; partNo: 860010374011; E-mail: libraries@we-online.com; Characteristics: Aluminum Electrolytic Capacitor; Recommended soldering: Wave; Operating temperature:–40 °C to +85 °C for UR < 400 V; 25 °C to +85 °C for UR ≥ 400 V; Wide capacitance value range; Load life: 2000 h @ +85 °C; ComponentLink1Description: Manufacturer; ComponentLink1URL: http://www.we-online.com; ComponentLink2Description: Datasheet; ComponentLink2URL: http://katalog.we-online.de/pbs/datasheet/860010374011.pdf; Created by: Karrer Zheng; Created Date: 6/8/2015; Capacitance: 330 μF; Application: Medium and high voltage type range from 160V-450V used as primary side input filter in power supply; Low voltage type used as energy storage or low frequency filtering in circuit, applied to general switching power supply, AC-DC converter, adapter, charger, TV, VCR, DC motor circuit filter, digital audio, digital cameras, digital video cameras, satellite receiver etc.
footprint WCAP-ATG8 8x11.5x3.5x0.5
pins: 1, 2

## WCAP-ATG8 8x11.5x3.5x0.5 860010374012
designator C?, comment 470 μF
WCAP-ATG8 Aluminum Electrolytic Capacitors , 470 μF; + / - 20%; 16 V , 8 x 11,5; Manufacturer: Wurth Elektronik; partNo: 860010374012; E-mail: libraries@we-online.com; Characteristics: Aluminum Electrolytic Capacitor; Recommended soldering: Wave; Operating temperature:–40 °C to +85 °C for UR < 400 V; 25 °C to +85 °C for UR ≥ 400 V; Wide capacitance value range; Load life: 2000 h @ +85 °C; ComponentLink1Description: Manufacturer; ComponentLink1URL: http://www.we-online.com; ComponentLink2Description: Datasheet; ComponentLink2URL: http://katalog.we-online.de/pbs/datasheet/860010374012.pdf; Created by: Karrer Zheng; Created Date: 6/8/2015; Capacitance: 470 μF; Application: Medium and high voltage type range from 160V-450V used as primary side input filter in power supply; Low voltage type used as energy storage or low frequency filtering in circuit, applied to general switching power supply, AC-DC converter, adapter, charger, TV, VCR, DC motor circuit filter, digital audio, digital cameras, digital video cameras, satellite receiver etc.
footprint WCAP-ATG8 8x11.5x3.5x0.5
pins: 1, 2

## WCAP-ATG8 8x16x3.5x0.5 860010374014
designator C?, comment 680 μF
WCAP-ATG8 Aluminum Electrolytic Capacitors , 680 μF; + / - 20%; 16 V , 8 x 16; Manufacturer: Wurth Elektronik; partNo: 860010374014; E-mail: libraries@we-online.com; Characteristics: Aluminum Electrolytic Capacitor; Recommended soldering: Wave; Operating temperature:–40 °C to +85 °C for UR < 400 V; 25 °C to +85 °C for UR ≥ 400 V; Wide capacitance value range; Load life: 2000 h @ +85 °C; ComponentLink1Description: Manufacturer; ComponentLink1URL: http://www.we-online.com; ComponentLink2Description: Datasheet; ComponentLink2URL: http://katalog.we-online.de/pbs/datasheet/860010374014.pdf; Created by: Karrer Zheng; Created Date: 6/8/2015; Capacitance: 680 μF; Application: Medium and high voltage type range from 160V-450V used as primary side input filter in power supply; Low voltage type used as energy storage or low frequency filtering in circuit, applied to general switching power supply, AC-DC converter, adapter, charger, TV, VCR, DC motor circuit filter, digital audio, digital cameras, digital video cameras, satellite receiver etc.
footprint WCAP-ATG8 8x16x3.5x0.5
pins: 1, 2

## WCAP-ATG8 10x12.5x5x0.6 860010375013
designator C?, comment 560 μF
WCAP-ATG8 Aluminum Electrolytic Capacitors , 560 μF; + / - 20%; 16 V , 10 x 12,5; Manufacturer: Wurth Elektronik; partNo: 860010375013; E-mail: libraries@we-online.com; Characteristics: Aluminum Electrolytic Capacitor; Recommended soldering: Wave; Operating temperature:–40 °C to +85 °C for UR < 400 V; 25 °C to +85 °C for UR ≥ 400 V; Wide capacitance value range; Load life: 2000 h @ +85 °C; ComponentLink1Description: Manufacturer; ComponentLink1URL: http://www.we-online.com; ComponentLink2Description: Datasheet; ComponentLink2URL: http://katalog.we-online.de/pbs/datasheet/860010375013.pdf; Created by: Karrer Zheng; Created Date: 6/8/2015; Capacitance: 560 μF; Application: Medium and high voltage type range from 160V-450V used as primary side input filter in power supply; Low voltage type used as energy storage or low frequency filtering in circuit, applied to general switching power supply, AC-DC converter, adapter, charger, TV, VCR, DC motor circuit filter, digital audio, digital cameras, digital video cameras, satellite receiver etc.
footprint WCAP-ATG8 10x12.5x5x0.6
pins: 1, 2
